# Altium footprint library Rocket_library.PcbLib: 65 footprints (part 2 of 5)
Each footprint in its own frame and in the unit in brackets; x right, y up, seen from the top. Pads: shape width x height; smd on the part's side, far side on the other; paste and mask are expansions set on the pad; w line width, h text height; cw(c..) or ccw(c..) is an arc to the next point about the centre after c.
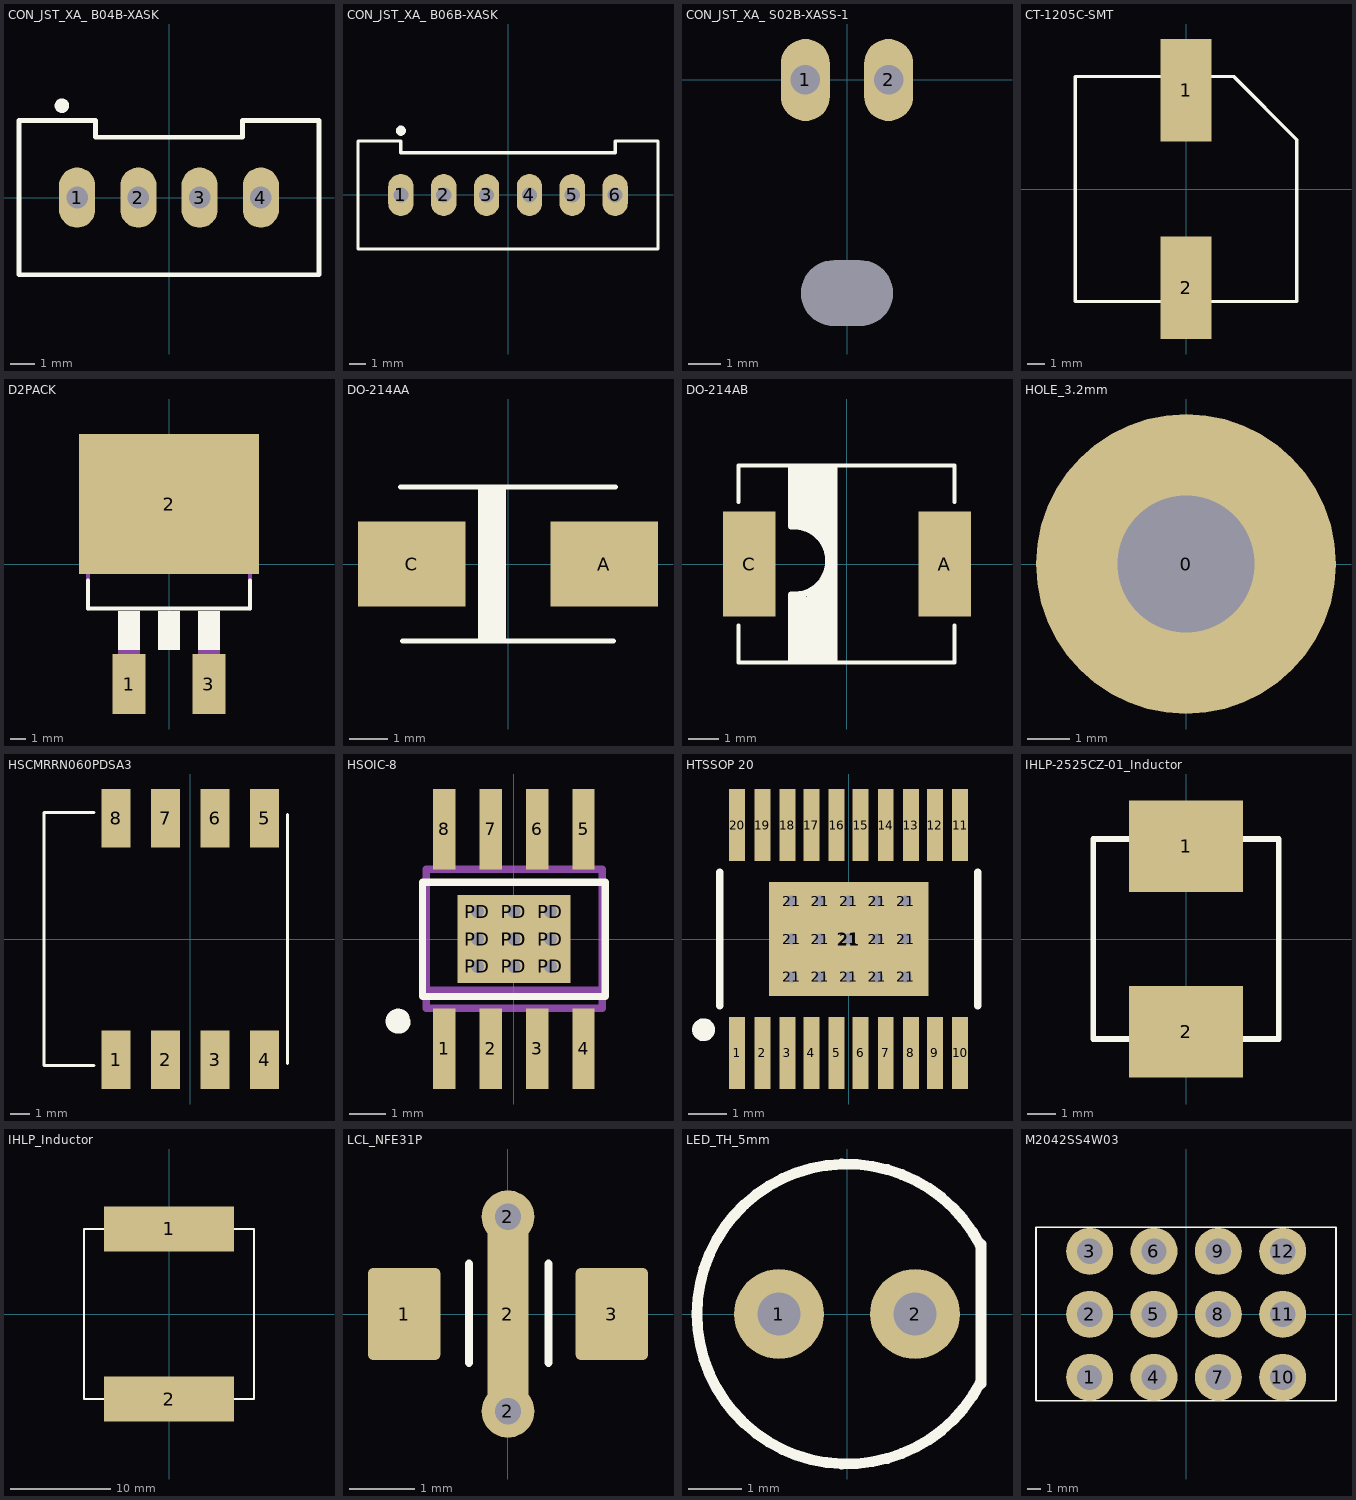
[diagram p1: the footprints below, top view; thin cyan lines are the x and y axes]

## CON_JST_XA_ B04B-XASK [mm] "Embases Hdr Singl Row 4Ckt 3A"
pads (4):
  oval 1.5x2.5 hole 0.9: 1(-3.81,0) 2(-1.27,0) 3(1.27,0) 4(3.81,0)
Top Overlay:
  circle w0.4: c-4.445,3.81 r0.1
  lines w0.2: -6.223,-3.2 -6.223,3.2 -3.048,3.2 -3.048,2.5 3.048,2.5 3.048,3.2 6.223,3.2 6.223,-3.2 -6.223,-3.2
3D body "B04B-XASK-1.STEP": height 8.8, standoff -3.4, extent -6.25,-3.2 6.25,3.2

## CON_JST_XA_ B06B-XASK [mm] "Embases Hdr Singl Row 6Ckt 3A"
pads (6):
  oval 1.5x2.5 hole 0.9: 1(-6.35,0) 2(-3.81,0) 3(-1.27,0) 4(1.27,0) 5(3.81,0) 6(6.35,0)
Top Overlay:
  circle w0.4: c-6.35,3.81 r0.1
  lines w0.2: -8.89,-3.2 8.89,-3.2 8.89,3.2 6.35,3.2 6.35,2.5 -6.35,2.5 -6.35,3.2 -8.89,3.2 -8.89,-3.2
3D body "B06B-XASK-1.STEP": height 8.8, standoff -3.4, extent -8.75,-3.2 8.75,3.2

## CON_JST_XA_ S02B-XASS-1 [mm] "Embases Hdr Singl Row 2Ckt 3A"
pads (3):
  oval 1.5x2.5 hole 0.9: 1(-1.27,0) 2(1.27,0)
  round 0 hole 2 slot 2.8 at 0 deg unplated: ""(0,-6.5)
3D body "S02B-XASS-1.STEP": height 7.6, standoff -3.5, extent -3.75,-9.2 3.75,3.4

## CT-1205C-SMT [mm]
height 10
pads (2):
  rect 3x6 smd: 1(0,5.8) 2(0,-5.8)
Top Overlay:
  lines w0.2: -6.5,-6.6 6.5,-6.6 6.5,2.9 2.8,6.6 -6.5,6.6 -6.5,-6.6
3D body "CT-1205C-SMT.stp": height 10.1, standoff 0.1, extent -6.4,-6.9 6.4,6.9

## D2PACK [mil]
pads (3):
  rect 82x150 smd: 1(-100,-300) 3(100,-300)
  rect 450x350 smd: 2(0,150)
Top Overlay:
  rectangle: -28,-215 28,-117
  rectangle: 72,-215 128,-117
  rectangle: -128,-215 -72,-117
  lines w10: -202,-41 -202,-111 202,-111 202,-41
Mechanical 16:
  rectangle: 72,-271 128,-215
  rectangle: 78,-325 122,-269
  rectangle: -128,-271 -72,-215
  rectangle: -122,-325 -78,-269
  lines w10: -202,-111 -202,235 -133,279 123,279 202,225 ; -202,225 202,225 ; 202,-111 202,225
3D body "User Library-TO263-3-1.STEP": height 181.1, standoff -1.14, extent -204.72,-340.55 204.72,283.46

## DO-214AA [mm]
pads (2):
  rect 2.8x2.2 smd: A(2.5,0) C(-2.5,0)
Top Overlay:
  rectangle: -0.775,-2 -0.05,2
  lines w0.127: -2.8,2 2.8,2 ; -2.75,-2 2.75,-2
3D body "DO-214AA.STEP": height 2.45, standoff 0.03, extent -2.75,-1.95 2.75,1.95

## DO-214AB [mil]
pads (2):
  rect 67x134 smd: A(125,0) C(-124.02,0)
Top Overlay:
  lines w5: -137.8,-78.74 -137.8,-125.98 138,-125.98 138,-78.74 ; -137.8,79 -137.8,126 138,126 138,79
  lines w8: -70.87,123 -70.87,48 -62.99,48 -62.99,123 ; -66.93,-114.17 -70.87,-122.05 -70.87,-39.37 -62.99,-39.37 -62.99,-122.05 -39.37,-122.05 ; -66.93,-39.37 ccw(c-66.93,4.32) -66.93,48 ; -55.12,-118.11 -55.12,-43.31 ; -55.12,48 -55.12,123 ; -47.24,-118.11 -47.24,-39.37 ; -47.24,44 -47.24,123 ; -39.37,-118.11 -39.37,-31.5 ; -39.37,40 -39.37,123 ; -35.43,-122.05 -31.5,-122.05 ; -31.5,-23.62 -31.5,-122.05 ; -31.5,32 -31.5,123 ; -23.62,123 -23.62,-122.05 ; -15.75,123 -15.75,-122.05 -23.62,-122.05 ; -31.5,-122.05 -23.62,-122.05

## HOLE_3.2mm [mm]
pads (1):
  round 7 hole 3.2: 0(0,0)

## HSCMRRN060PDSA3 [mm] "Pressure sensor"
pads (8):
  rect 1.5x3 smd: 1(-3.81,-6.2) 2(-1.27,-6.2) 3(1.27,-6.2) 4(3.81,-6.2) 5(3.81,6.2) 6(1.27,6.2) 7(-1.27,6.2) 8(-3.81,6.2)
Top Overlay:
  lines w0.152: -4.95,-6.5 -7.5,-6.5 -7.5,6.5 -4.95,6.5 ; 5,-6.4 5,6.4
3D body "User Library-HSCMRRxxxxxxxx.step": height 6.77, standoff 0.01, extent -7.75,-6.675 5,6.675

## HSOIC-8 [mm]
pads (18):
  rect 0.61x2.21 smd: 1(-1.905,-3) 2(-0.635,-3) 3(0.635,-3) 4(1.905,-3) 5(1.905,3) 6(0.635,3) 7(-0.635,3) 8(-1.905,3)
  round 0.8 hole 0.35: PD(-1,-0.75) PD(-1,0) PD(-1,0.75) PD(0,-0.75) PD(0,0) PD(0,0.75) PD(1,-0.75) PD(1,0) PD(1,0.75)
  rect 3.1x2.4 smd: PD(0,0)
Top Overlay:
  lines w0.2: -2.5,-1.575 2.5,-1.575 2.5,1.55 -2.5,1.55 -2.5,-1.575
  lines w0.35: -3.037,-2.145 ccw(c-3.168,-2.25) -3,-2.25
Mechanical 16:
  rectangle: -2.15,2.007 -1.66,3.124
  rectangle: -0.88,2.007 -0.39,3.124
  rectangle: 0.406,2.007 0.889,3.124
  rectangle: 1.676,2.007 2.159,3.124
  rectangle: 1.676,-3.099 2.159,-1.999
  rectangle: 0.406,-3.099 0.889,-1.999
  rectangle: -0.88,-3.1 -0.39,-2
  rectangle: -2.15,-3.099 -1.66,-1.999
  lines w0.203: -2.4,-1.4 2.413,-1.4 ; -2.4,-1.4 -2.4,1.905 2.413,1.905 2.413,-1.4 ; -2.4,-1.4 -2.4,-1.9 2.413,-1.9 2.413,-1.4
3D body "User Library-SOIC8_JEDEC_MS-012AA.STEP": height 1.75, standoff -0.01, extent -2.5,-3.099 2.5,3.1

## HTSSOP 20 [mm]
pads (36):
  rect 0.42x1.9 smd: 1(-2.935,-3) 2(-2.275,-3) 3(-1.614,-3) 4(-0.979,-3) 5(-0.319,-3) 6(0.316,-3) 7(0.977,-3) 8(1.637,-3) 9(2.272,-3) 10(2.932,-3) 11(2.932,3) 12(2.272,3) 13(1.637,3) 14(0.977,3) 15(0.316,3) 16(-0.319,3) 17(-0.979,3) 18(-1.614,3) 19(-2.275,3) 20(-2.935,3)
  round 0.6 hole 0.3: 21(-1.5,-1) 21(-1.5,0) 21(-1.5,1) 21(-0.75,-1) 21(-0.75,0) 21(-0.75,1) 21(0,-1) 21(0,0) 21(0,1) 21(0.75,-1) 21(0.75,0) 21(0.75,1) 21(1.5,-1) 21(1.5,0) 21(1.5,1)
  rect 4.2x3 smd: 21(0,0)
Top Overlay:
  circle w0.3: c-3.82,-2.39 r0.15
  lines w0.2: -3.4,-1.75 -3.4,1.75 ; 3.4,-1.75 3.4,1.75
3D body "User Library-HTSSOP20.step": height 0.95, standoff -0.06, extent -3.27,-3.197 3.23,3.217

## IHLP-2525CZ-01_Inductor [mm]
pads (2):
  rect 4x3.2 smd: 1(0,3.25) 2(0,-3.25)
Top Overlay:
  lines w0.2: -3.25,-3.5 3.25,-3.5 3.25,3.5 -3.25,3.5 -3.25,-3.5
3D body "User Library-IHLP-2525CZ.step": height 3, standoff 0, extent -3.235,-3.43 3.235,3.43

## IHLP_Inductor [mm]
pads (2):
  rect 13x4.5 smd: 1(0,8.5) 2(0,-8.5)
Top Overlay:
  lines w0.2: -8.5,-8.5 8.5,-8.5 8.5,8.5 -8.5,8.5 -8.5,-8.5
3D body "IHLP-6767DZ.stp": height 4.06, standoff 0, extent -8.573,-8.636 8.573,8.636

## LCL_NFE31P [mil]
pads (5):
  rrect15% 44x56 smd: 1(-62.99,0) 3(63,0)
  round 32.01 hole 16: 2(0,-59.06) 2(0,59.06)
  rect 25x103 smd: 2(0,0)
Top Overlay:
  lines w5: -23.62,-29.53 -23.62,30.47 ; 24.61,-29.53 24.61,30.47
Top Paste:
  rectangle: -11.81,12 12,52
  rectangle: -11.81,-51.18 12,-11.81
  rectangle: 42,-27.56 85,28
  rectangle: -84.65,-27.56 -41.34,28
Top Solder:
  rectangle: 32,-31.5 89,32
  rectangle: -88.58,-31.5 -31.5,32
  region: -11.81,-59.06 -11.81,60 -11.73,62.27 -9.84,66.4 -6.52,69.49 -2.27,71.08 0,71 2.29,71.1 6.59,69.53 9.97,66.44 11.9,62.29 12,60 12,-59.06 11.98,-61.42 10.13,-65.78 6.76,-69.11 2.37,-70.88 0,-70.87 -2.35,-70.87 -6.69,-69.07 -10.01,-65.75 -11.81,-61.4
3D body "User Library-NFE61P seriesNFE31P series.STEP": height 62.99, standoff 0, extent -62.99,-31.5 62.99,31.5

## LED_TH_5mm [mil]
pads (2):
  round 66 hole 31.5: 1(-50,0) 2(50,0)
Top Overlay:
  lines w7.87: 97.8,-50.86 cw(c0,0) 97.8,50.86 ; 98.43,-51.18 98.43,51.18

## M2042SS4W03 [mm]
pads (12):
  round 3.5 hole 1.85: 1(-7.2,-4.7)
  round 3.5 hole 1.9: 2(-7.2,0) 3(-7.2,4.7) 4(-2.4,-4.7) 5(-2.4,0) 6(-2.4,4.7) 7(2.4,-4.7) 8(2.4,0) 9(2.4,4.7) 10(7.2,-4.7) 11(7.2,0) 12(7.2,4.7)
Top Overlay:
  lines w0.127: -11.2,-6.45 11.175,-6.45 11.175,6.5 -11.2,6.5 -11.2,-6.45
3D body "M2042SS4W03.stp": height 32.68, standoff -4.81, extent -11.15,-6.502 11.151,7.112